# Altium footprint library 20210518.PcbLib: 414 footprints (part 26 of 26)
Each footprint in its own frame and in the unit in brackets; x right, y up, seen from the top. Pads: shape width x height; smd on the part's side, far side on the other; paste and mask are expansions set on the pad; w line width, h text height; cw(c..) or ccw(c..) is an arc to the next point about the centre after c.
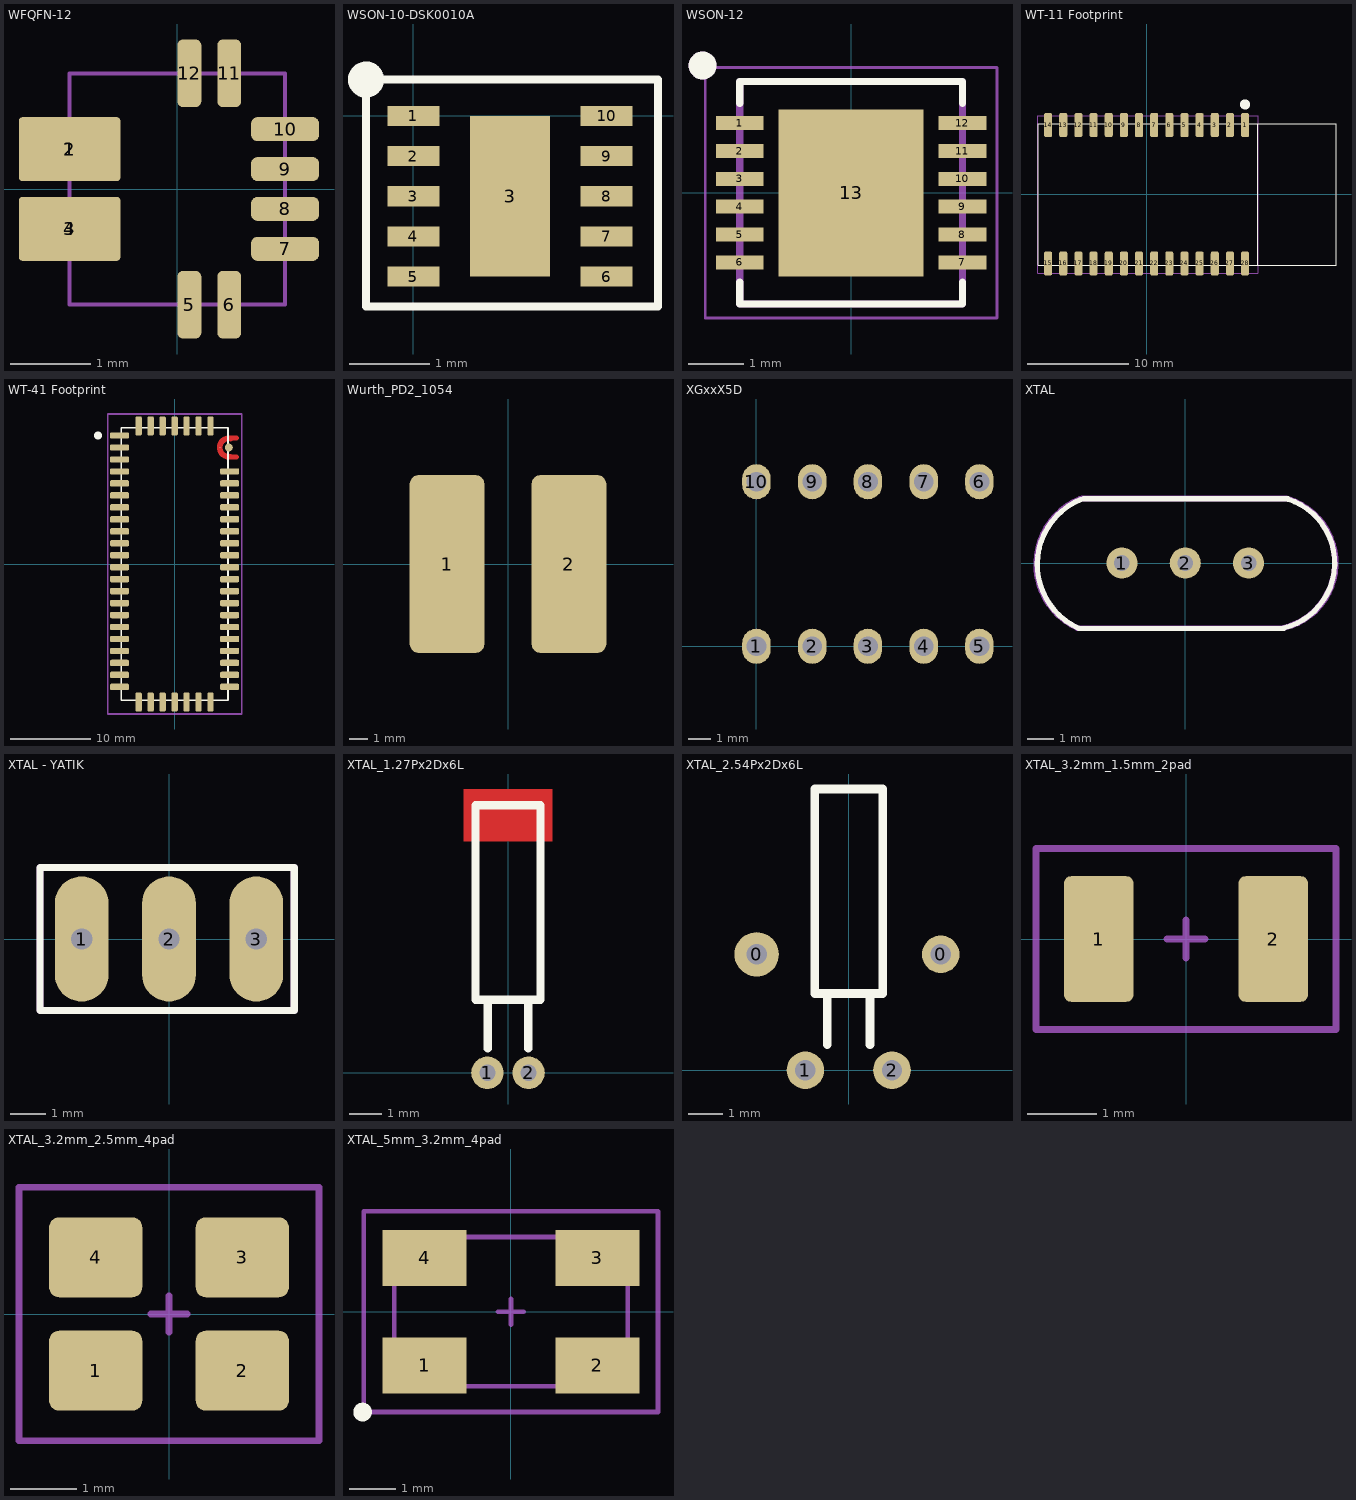
[diagram p25: the footprints below, top view; thin cyan lines are the x and y axes]

## WFQFN-12 [mm]
pads (12):
  rrect10% 1.27x0.8 smd mask+0.05: 1(-1.35,0.5) 2(-1.35,0.5) 3(-1.35,-0.5) 4(-1.35,-0.5)
  rrect50% 0.3x0.85 smd mask+0.05: 5(0.15,-1.45) 6(0.65,-1.45) 11(0.65,1.45) 12(0.15,1.45)
  rrect50% 0.85x0.3 smd mask+0.05: 7(1.35,-0.75) 8(1.35,-0.25) 9(1.35,0.25) 10(1.35,0.75)
Mechanical 13:
  lines w0.05: -1.35,-1.45 1.35,-1.45 1.35,1.45 -1.35,1.45 -1.35,-1.45
3D body: height 0.75, standoff 0, extent -1.375,-1.475 1.375,1.475

## WSON-10-DSK0010A [mm] "2.50 mm x 2.50 mm"
height 0.8
pads (11):
  rect 0.65x0.25 smd: 1(0,0) 2(0,-0.5) 3(0,-1) 4(0,-1.5) 5(0,-2) 6(2.4,-2) 7(2.4,-1.5) 8(2.4,-1) 9(2.4,-0.5) 10(2.4,0)
  rect 1x2 smd paste-3: 3(1.2,-1)
Top Overlay:
  circle w0.25: c-0.59,0.45 r0.1
  lines w0.1: -0.59,-2.37 3.04,-2.37 3.04,0.45 -0.59,0.45 -0.59,-2.37
3D body: height 0.77, standoff 0, extent -0.05,-2.25 2.45,0.25

## WSON-12 [mm]
height 2.03
pads (13):
  rect 0.86x0.25 smd: 1(-2,1.25) 2(-2,0.75) 3(-2,0.25) 4(-2,-0.25) 5(-2,-0.75) 6(-2,-1.25) 7(2,-1.25) 8(2,-0.75) 9(2,-0.25) 10(2,0.25) 11(2,0.75) 12(2,1.25)
  rect 2.6x3 smd paste-3: 13(0,0)
Top Overlay:
  circle w0.3: c-2.667,2.286 r0.1
  lines w0.127: -2,-1.6 -2,-2 2,-2 2,-1.6 ; -2,1.6 -2,2 2,2 2,1.6
Top Paste:
  region: 0.135,-0.135 1.025,-0.135 1.025,-1.227 0.135,-1.227
  region: -1.027,-0.135 -0.135,-0.135 -0.135,-1.227 -1.027,-1.227
  region: 0.135,1.225 1.025,1.225 1.025,0.135 0.135,0.135
  region: -1.027,1.225 -0.135,1.225 -0.135,0.135 -1.027,0.135
Mechanical 4:
  lines w0.05: -2.62,-2.25 -2.62,2.25 2.62,2.25 2.62,-2.25 -2.62,-2.25
Mechanical 13:
  circle w0.3: c-2.667,2.286 r0.1
  lines w0.127: -2,-2 -2,2 2,2 2,-2 -2,-2
3D body: height 0.8, standoff 0, extent -2,-2 2,2

## WT-11 Footprint [mm] "Bluegiga WT-11 Footprint"
pads (28):
  rrect50% 0.8x2.4 smd: 1(9.75,6.85) 2(8.25,6.85) 3(6.75,6.85) 4(5.25,6.85) 5(3.75,6.85) 6(2.25,6.85) 7(0.75,6.85) 8(-0.75,6.85) 9(-2.25,6.85) 10(-3.75,6.85) 11(-5.25,6.85) 12(-6.75,6.85) 13(-8.25,6.85) 14(-9.75,6.85) 15(-9.75,-6.85) 16(-8.25,-6.85) 17(-6.75,-6.85) 18(-5.25,-6.85) 19(-3.75,-6.85) 20(-2.25,-6.85) 21(-0.75,-6.85) 22(0.75,-6.85) 23(2.25,-6.85) 24(3.75,-6.85) 25(5.25,-6.85) 26(6.75,-6.85) 27(8.25,-6.85) 28(9.75,-6.85)
Top Overlay:
  circle w0.6: c9.75,8.9 r0.2
  lines w0.1: 10.95,-7 18.75,-7 18.75,7 10.95,7 ; -10.75,-7 -10.75,7 11.006,7 10.996,-7 -10.75,-7
Mechanical 15:
  lines w0.1: -10.8,-7.8 -10.8,7.8 10.991,7.8 11.002,-7.8 -10.8,-7.8
3D body: height 2.3, standoff 0, extent -10.75,-7 24.55,7

## WT-41 Footprint [mm] "Bluegiga WT-41 Footprint"
pads (57):
  rrect50% 2.4x0.8 smd: 2(-6.9,16.1) 3(-6.9,14.6) 4(-6.9,13.1) 5(-6.9,11.6) 6(-6.9,10.1) 7(-6.9,8.6) 8(-6.9,7.1) 9(-6.9,5.6) 10(-6.9,4.1) 11(-6.9,2.6) 12(-6.9,1.1) 13(-6.9,-0.4) 14(-6.9,-1.9) 15(-6.9,-3.4) 16(-6.9,-4.9) 17(-6.9,-6.4) 18(-6.9,-7.9) 19(-6.9,-9.4) 20(-6.9,-10.9) 21(-6.9,-12.4) 22(-6.9,-13.9) 23(-6.9,-15.4) 31(6.9,-15.4) 32(6.9,-13.9) 33(6.9,-12.4) 34(6.9,-10.9) 35(6.9,-9.4) 36(6.9,-7.9) 37(6.9,-6.4) 38(6.9,-4.9) 39(6.9,-3.4) 40(6.9,-1.9) 41(6.9,-0.4) 42(6.9,1.1) 43(6.9,2.6) 44(6.9,4.1) 45(6.9,5.6) 46(6.9,7.1) 47(6.9,8.6) 48(6.9,10.1) 49(6.9,11.6)
  rrect50% 0.8x2.4 smd: 24(-4.5,-17.3) 25(-3,-17.3) 26(-1.5,-17.3) 27(0,-17.3) 28(1.5,-17.3) 29(3,-17.3) 30(4.5,-17.3) 53(4.5,17.3) 54(3,17.3) 55(1.5,17.3) 56(0,17.3) 57(-1.5,17.3) 58(-3,17.3) 59(-4.5,17.3)
  round 0.1 smd paste+0 mask+0: 50(5.7,14.6)
  round 1 smd: 51(6.8,14.6)
Top Layer:
  lines w0.6: 6.8,13.4 7.8,13.4 ; 6.8,15.8 7.8,15.8
  lines w0.7: 6.989,13.466 cw(c6.8,14.6) 7.006,15.731
Top Overlay:
  circle w0.6: c-9.6,16.1 r0.2
  lines w0.2: -6.7,-17.1 6.7,-17.1 6.7,17.1 -6.7,17.1 -6.7,-17.1
Top Solder:
  lines w0.6: 6.8,13.4 7.8,13.4 ; 6.8,15.8 7.8,15.8
  lines w0.7: 6.989,13.466 cw(c6.8,14.6) 7.006,15.731
Mechanical 15:
  lines w0.2: -8.4,-18.8 -8.4,18.8 8.4,18.8 8.4,-18.8 -8.4,-18.8

## Wurth_PD2_1054 [mm]
height 5.5
pads (2):
  rrect25% 4x9.5 smd mask+0: 1(-3.25,0) 2(3.25,0)
3D body: height 5.4, standoff -0.05, extent -4.994,-4.505 4.994,4.505

## XGxxX5D [mm] "Flat Top, 5.00mm x 1.60mm"
height 8
pads (10):
  oval 1.3x1.6 hole 0.9: 1(0,0) 2(2.54,0) 3(5.08,0) 4(7.62,0) 5(10.16,0) 6(10.16,7.5) 7(7.62,7.5) 8(5.08,7.5) 9(2.54,7.5) 10(0,7.5)
Bottom Overlay:
  lines w0.1: -2.71,7.39 -1.6,7.39 ; -2.485,0.06 -1.375,0.06 ; -1.93,-0.495 -1.93,0.615
  text "1" at -1.64,0.27 h0.5
3D body: height 8, standoff -4, extent -1.22,-1.3 11.38,8.8

## XTAL [mm] "Standart Radial, 2 pin, 4.88mm pin space, 0.6mm Hole, Body 11.5x5mm, 3.68 height"
height 3.68
pads (3):
  round 1.2 hole 0.6: 1(-2.44,0) 2(0,0) 3(2.44,0)
Top Overlay:
  lines w0.2: -4.116,-2.509 cw(c-3,-0.05) -4.02,2.45 ; -4.1,-2.525 3.8,-2.525 ; -3.925,2.475 3.95,2.475 ; 3.777,-2.508 ccw(c3.175,0) 3.953,2.459
Mechanical 13:
  lines w0.2: -4.166,-2.484 cw(c-3.05,-0.025) -4.07,2.475 ; -4.15,-2.5 3.75,-2.5 ; -3.975,2.5 3.9,2.5 ; 3.777,-2.483 ccw(c3.175,0.025) 3.953,2.484
Mechanical 15:
  lines w0.2: -4.166,-2.509 cw(c-3.05,-0.05) -4.07,2.45 ; -4.15,-2.525 3.75,-2.525 ; -3.975,2.475 3.9,2.475 ; 3.827,-2.508 ccw(c3.225,0) 4.003,2.459
3D body: height 3.63, standoff -1.97, extent -5.485,-2.325 5.687,2.347

## XTAL - YATIK [mm] "Standart Radial, 2 pin, 4.88mm pin space, 0.6mm Hole, Body 11.5x5mm, 3.68 height"
height 3.68
pads (3):
  oval 1.5x3.5 hole 0.6: 1(-2.44,0) 2(0,0) 3(2.44,0)
Top Overlay:
  lines w0.2: -3.6,-2 -3.6,2 3.5,2 3.5,-2 -3.6,-2
Mechanical 13:
  lines w0.2: -3.6,-2 -3.6,2 3.5,2 3.5,-2 -3.6,-2
Mechanical 15:
  lines w0.2: -3.6,-2 -3.6,2 3.5,2 3.5,-2 -3.6,-2
3D body: height 2.35, standoff -2.32, extent -5.486,-6.1 5.686,-0.5

## XTAL_1.27Px2Dx6L [mm] "Crystal, 1.27 pin space, yatik"
height 2
pads (2):
  round 1 hole 0.5: 1(-0.635,0) 2(0.635,0)
Top Layer:
  rectangle: -1.375,7.125 1.375,8.75
Top Overlay:
  lines w0.254: -0.625,0.75 -0.625,2.25 ; 0.625,0.75 0.625,2.25 ; -1,2.25 1,2.25 1,8.25 -1,8.25 -1,2.25
Top Solder:
  rectangle: -1.375,7.125 1.375,8.75
3D body: height 2.05, standoff -0.05, extent -1.2,-2.5 1.6,8.7

## XTAL_2.54Px2Dx6L [mm] "Crystal, 2.54 pin space, yatik"
height 2
pads (4):
  round 1.3 hole 0.6: 0(-2.7,3.4)
  round 1.1 hole 0.6: 0(2.7,3.4) 1(-1.27,0) 2(1.27,0)
Top Overlay:
  lines w0.254: -0.625,0.75 -0.625,2.25 ; 0.625,0.75 0.625,2.25 ; -1,2.25 -1,8.25 1,8.25 1,2.25 -1,2.25
3D body: height 2.05, standoff -0.05, extent -1.2,-2.5 1.6,8.7

## XTAL_3.2mm_1.5mm_2pad [mm]
height 1.3
pads (2):
  rrect20% 1x1.8 smd mask+0.102: 1(-1.25,0) 2(1.25,0)
Mechanical 15:
  lines w0.1: -0.275,0 0.275,0 ; 0,-0.275 0,0.275 ; -2.15,-1.3 -2.15,1.3 2.15,1.3 2.15,-1.3 -2.15,-1.3
3D body: height 0.91, standoff 0, extent -1.61,-0.76 1.61,0.76

## XTAL_3.2mm_2.5mm_4pad [mm]
height 1.3
pads (4):
  rrect25% 1.4x1.2 smd mask+0.102: 1(-1.1,-0.85) 2(1.1,-0.85) 3(1.1,0.85) 4(-1.1,0.85)
Mechanical 15:
  lines w0.1: -0.275,0 0.275,0 ; 0,-0.275 0,0.275 ; -2.25,-1.9 -2.25,1.9 2.25,1.9 2.25,-1.9 -2.25,-1.9
3D body: height 0.1, standoff 0, extent 0.6,-1.2 1.55,-0.35
3D body: height 0.1, standoff 0, extent 0.6,0.35 1.55,1.2
3D body: height 0.1, standoff 0, extent -1.55,0.35 -0.6,1.2
3D body: height 0.1, standoff 0, extent -1.55,-1.2 -0.6,-0.35
3D body: height 0.81, standoff 0.01, extent -1.65,-1.3 1.65,1.3

## XTAL_5mm_3.2mm_4pad [mm]
height 1.3
pads (4):
  rect 1.8x1.2 smd mask+0.102: 1(-1.85,-1.15) 2(1.85,-1.15) 3(1.85,1.15) 4(-1.85,1.15)
Top Overlay:
  circle w0.2: c-3.175,-2.15 r0.1
Mechanical 13:
  lines w0.1: -2.5,-1.6 -2.5,1.6 2.5,1.6 2.5,-1.6 -2.5,-1.6
Mechanical 15:
  lines w0.1: -0.275,0 0.275,0 ; 0,-0.275 0,0.275 ; -3.15,-2.15 3.15,-2.15 3.15,2.15 -3.15,2.15 -3.15,-2.15
3D body: height 1, standoff 0, extent -2.5,-1.6 2.5,1.6